# Altium schematic symbol library jlcpcb_2025_04_capacitors_extended_1206.schlib: 2503 symbols (part 4 of 14) (continued)
## C1206N220J102T
designator C?  Capacitance: 22pF  (hidden comment: *)
Capacitor, Ceramic (MLCC), 22pF, ±5%, 1kV, NP0, ±5%, SMD 1206; Manufacturer: IHHEC(HOLY STONE ENTERPRISE CO., LTD); Manufacturer Part Number: C1206N220J102T; Package Size: 1206; JLCPCB Basic Part: No; JLCPCB Part Number: C105975; Supplier 1: LCSC; Category: Capacitors - MLCC; Supplier Part Number 1: C105975; Tolerance: ±5%; Voltage Rating: 1kV; Temperature Coefficient: NP0; RoHS: Yes; ComponentLink1Description: Datasheet; ComponentLink1URL: https://wmsc.lcsc.com/wmsc/upload/file/pdf/v2/lcsc/2304140030_IHHEC-HOLY-STONE-ENTERPRISE-CO---LTD-C1206N220J102T_C105975.pdf; ComponentLink2Description: JLCPCB Part URL; ComponentLink2URL: https://jlcpcb.com/partdetail/C105975; ComponentLink3Description: LCSC Part URL; ComponentLink3URL: https://lcsc.com/product-detail/Multilayer-Ceramic-Capacitors-MLCC---SMD-SMT_IHHECHOLY-STONE-ENTERPRISE-CO.%2C-LTD-IHHECHOLY-STONE-ENTERPRISE-CO.%2C-LTD-C1206N220J102T_C105975.html
footprint CAP-1206 (1206 (3216M) Capacitor)
pins: 1, 2

## C1206N221J102T
designator C?  Capacitance: 220pF  (hidden comment: *)
Capacitor, Ceramic (MLCC), 220pF, ±5%, 1kV, C0G, ±5%, SMD 1206; Manufacturer: IHHEC(HOLY STONE ENTERPRISE CO., LTD); Manufacturer Part Number: C1206N221J102T; Package Size: 1206; JLCPCB Basic Part: No; JLCPCB Part Number: C105976; Supplier 1: LCSC; Category: Capacitors - MLCC; Supplier Part Number 1: C105976; Tolerance: ±5%; Voltage Rating: 1kV; Temperature Coefficient: C0G; RoHS: Yes; ComponentLink1Description: Datasheet; ComponentLink1URL: https://wmsc.lcsc.com/wmsc/upload/file/pdf/v2/lcsc/2304140030_IHHEC-HOLY-STONE-ENTERPRISE-CO---LTD-C1206N221J102T_C105976.pdf; ComponentLink2Description: JLCPCB Part URL; ComponentLink2URL: https://jlcpcb.com/partdetail/C105976; ComponentLink3Description: LCSC Part URL; ComponentLink3URL: https://lcsc.com/product-detail/Multilayer-Ceramic-Capacitors-MLCC---SMD-SMT_IHHECHOLY-STONE-ENTERPRISE-CO.%2C-LTD-IHHECHOLY-STONE-ENTERPRISE-CO.%2C-LTD-C1206N221J102T_C105976.html
footprint CAP-1206 (1206 (3216M) Capacitor)
pins: 1, 2

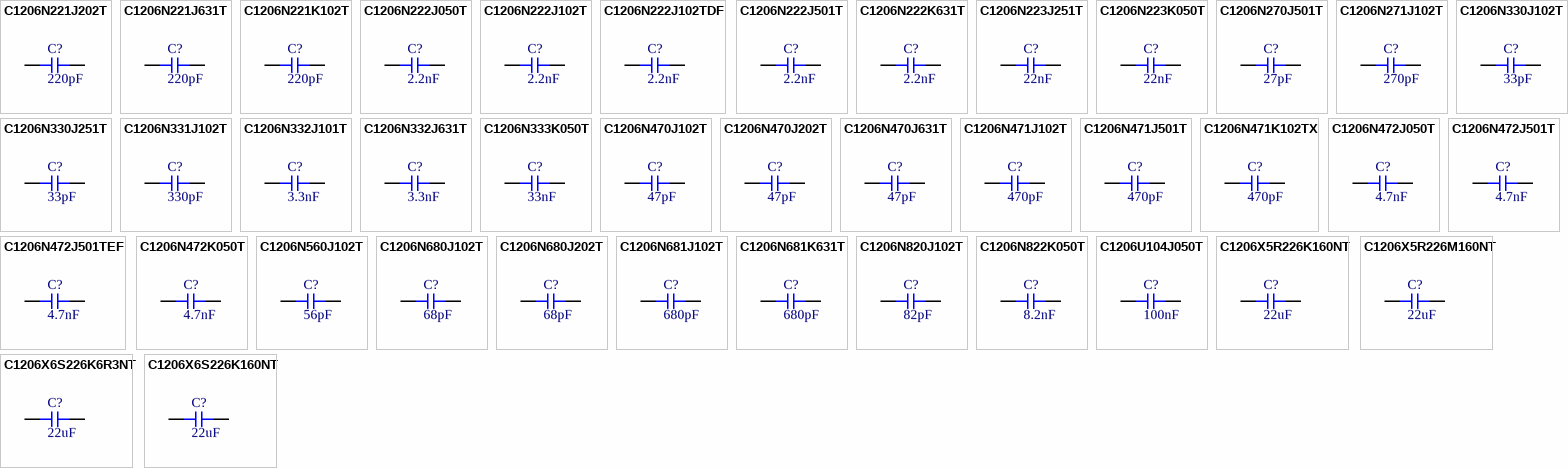
[diagram p17: symbols C1206N221J202T to C1206X6S226K160NT]

## C1206N221J202T
designator C?  Capacitance: 220pF  (hidden comment: *)
Capacitor, Ceramic (MLCC), 220pF, ±5%, 2kV, C0G, ±5%, SMD 1206; Manufacturer: IHHEC(HOLY STONE ENTERPRISE CO., LTD); Manufacturer Part Number: C1206N221J202T; Package Size: 1206; JLCPCB Basic Part: No; JLCPCB Part Number: C105977; Supplier 1: LCSC; Category: Capacitors - MLCC; Supplier Part Number 1: C105977; Tolerance: ±5%; Voltage Rating: 2kV; Temperature Coefficient: C0G; RoHS: Yes; ComponentLink1Description: Datasheet; ComponentLink1URL: https://wmsc.lcsc.com/wmsc/upload/file/pdf/v2/lcsc/2304140030_IHHEC-HOLY-STONE-ENTERPRISE-CO---LTD-C1206N221J202T_C105977.pdf; ComponentLink2Description: JLCPCB Part URL; ComponentLink2URL: https://jlcpcb.com/partdetail/C105977; ComponentLink3Description: LCSC Part URL; ComponentLink3URL: https://lcsc.com/product-detail/Multilayer-Ceramic-Capacitors-MLCC---SMD-SMT_IHHECHOLY-STONE-ENTERPRISE-CO.%2C-LTD-IHHECHOLY-STONE-ENTERPRISE-CO.%2C-LTD-C1206N221J202T_C105977.html
footprint CAP-1206 (1206 (3216M) Capacitor)
pins: 1, 2

## C1206N221J631T
designator C?  Capacitance: 220pF  (hidden comment: *)
Capacitor, Ceramic (MLCC), 220pF, ±5%, 630V, NP0, ±5%, SMD 1206; Manufacturer: IHHEC(HOLY STONE ENTERPRISE CO., LTD); Manufacturer Part Number: C1206N221J631T; Package Size: 1206; JLCPCB Basic Part: No; JLCPCB Part Number: C915819; Supplier 1: LCSC; Category: Capacitors - MLCC; Supplier Part Number 1: C915819; Tolerance: ±5%; Voltage Rating: 630V; Temperature Coefficient: NP0; RoHS: Yes; ComponentLink1Description: Datasheet; ComponentLink1URL: https://wmsc.lcsc.com/wmsc/upload/file/pdf/v2/lcsc/2304140030_IHHEC-HOLY-STONE-ENTERPRISE-CO---LTD-C1206N221J631T_C915819.pdf; ComponentLink2Description: JLCPCB Part URL; ComponentLink2URL: https://jlcpcb.com/partdetail/C915819; ComponentLink3Description: LCSC Part URL; ComponentLink3URL: https://lcsc.com/product-detail/Multilayer-Ceramic-Capacitors-MLCC---SMD-SMT_IHHECHOLY-STONE-ENTERPRISE-CO.%2C-LTD-IHHECHOLY-STONE-ENTERPRISE-CO.%2C-LTD-C1206N221J631T_C915819.html
footprint CAP-1206 (1206 (3216M) Capacitor)
pins: 1, 2

## C1206N221K102T
designator C?  Capacitance: 220pF  (hidden comment: *)
Capacitor, Ceramic (MLCC), 220pF, ±10%, 1kV, NP0, ±10%, SMD 1206; Manufacturer: IHHEC(HOLY STONE ENTERPRISE CO., LTD); Manufacturer Part Number: C1206N221K102T; Package Size: 1206; JLCPCB Basic Part: No; JLCPCB Part Number: C2826587; Supplier 1: LCSC; Category: Capacitors - MLCC; Supplier Part Number 1: C2826587; Tolerance: ±10%; Voltage Rating: 1kV; Temperature Coefficient: NP0; RoHS: Yes; ComponentLink1Description: Datasheet; ComponentLink2Description: JLCPCB Part URL; ComponentLink2URL: https://jlcpcb.com/partdetail/C2826587; ComponentLink3Description: LCSC Part URL; ComponentLink3URL: https://lcsc.com/product-detail/Multilayer-Ceramic-Capacitors-MLCC---SMD-SMT_IHHECHOLY-STONE-ENTERPRISE-CO.%2C-LTD-IHHECHOLY-STONE-ENTERPRISE-CO.%2C-LTD-C1206N221K102T_C2826587.html
footprint CAP-1206 (1206 (3216M) Capacitor)
pins: 1, 2

## C1206N222J050T
designator C?  Capacitance: 2.2nF  (hidden comment: *)
Capacitor, Ceramic (MLCC), 2.2nF, ±5%, 50V, NP0, ±5%, SMD 1206; Manufacturer: IHHEC(HOLY STONE ENTERPRISE CO., LTD); Manufacturer Part Number: C1206N222J050T; Package Size: 1206; JLCPCB Basic Part: No; JLCPCB Part Number: C105978; Supplier 1: LCSC; Category: Capacitors - MLCC; Supplier Part Number 1: C105978; Tolerance: ±5%; Voltage Rating: 50V; Temperature Coefficient: NP0; RoHS: Yes; ComponentLink1Description: Datasheet; ComponentLink1URL: https://wmsc.lcsc.com/wmsc/upload/file/pdf/v2/lcsc/2304140030_IHHEC-HOLY-STONE-ENTERPRISE-CO---LTD-C1206N222J050T_C105978.pdf; ComponentLink2Description: JLCPCB Part URL; ComponentLink2URL: https://jlcpcb.com/partdetail/C105978; ComponentLink3Description: LCSC Part URL; ComponentLink3URL: https://lcsc.com/product-detail/Multilayer-Ceramic-Capacitors-MLCC---SMD-SMT_IHHECHOLY-STONE-ENTERPRISE-CO.%2C-LTD-IHHECHOLY-STONE-ENTERPRISE-CO.%2C-LTD-C1206N222J050T_C105978.html
footprint CAP-1206 (1206 (3216M) Capacitor)
pins: 1, 2

## C1206N222J102T
designator C?  Capacitance: 2.2nF  (hidden comment: *)
Capacitor, Ceramic (MLCC), 2.2nF, 1kV, NP0, SMD 1206; Manufacturer: IHHEC(HOLY STONE ENTERPRISE CO., LTD); Manufacturer Part Number: C1206N222J102T; Package Size: 1206; JLCPCB Basic Part: No; JLCPCB Part Number: C2998557; Supplier 1: LCSC; Category: Capacitors - MLCC; Supplier Part Number 1: C2998557; Voltage Rating: 1kV; Temperature Coefficient: NP0; RoHS: Yes; ComponentLink1Description: Datasheet; ComponentLink1URL: https://wmsc.lcsc.com/wmsc/upload/file/pdf/v2/lcsc/2205051716_IHHEC-HOLY-STONE-ENTERPRISE-CO---LTD-C1206N222J102T_C2998557.pdf; ComponentLink2Description: JLCPCB Part URL; ComponentLink2URL: https://jlcpcb.com/partdetail/C2998557; ComponentLink3Description: LCSC Part URL; ComponentLink3URL: https://lcsc.com/product-detail/Multilayer-Ceramic-Capacitors-MLCC---SMD-SMT_IHHECHOLY-STONE-ENTERPRISE-CO.%2C-LTD-IHHECHOLY-STONE-ENTERPRISE-CO.%2C-LTD-C1206N222J102T_C2998557.html
footprint CAP-1206 (1206 (3216M) Capacitor)
pins: 1, 2

## C1206N222J102TDF
designator C?  Capacitance: 2.2nF  (hidden comment: *)
Capacitor, Ceramic (MLCC), 2.2nF, ±5%, 1kV, NP0, ±5%, SMD 1206; Manufacturer: IHHEC(HOLY STONE ENTERPRISE CO., LTD); Manufacturer Part Number: C1206N222J102TDF; Package Size: 1206; JLCPCB Basic Part: No; JLCPCB Part Number: C4355181; Supplier 1: LCSC; Category: Capacitors - MLCC; Supplier Part Number 1: C4355181; Tolerance: ±5%; Voltage Rating: 1kV; Temperature Coefficient: NP0; RoHS: Yes; ComponentLink1Description: Datasheet; ComponentLink1URL: https://wmsc.lcsc.com/wmsc/upload/file/pdf/v2/lcsc/2207151800_IHHEC-HOLY-STONE-ENTERPRISE-CO---LTD-C1206N222J102TDF_C4355181.pdf; ComponentLink2Description: JLCPCB Part URL; ComponentLink2URL: https://jlcpcb.com/partdetail/C4355181; ComponentLink3Description: LCSC Part URL; ComponentLink3URL: https://lcsc.com/product-detail/Multilayer-Ceramic-Capacitors-MLCC---SMD-SMT_IHHECHOLY-STONE-ENTERPRISE-CO.%2C-LTD-IHHECHOLY-STONE-ENTERPRISE-CO.%2C-LTD-C1206N222J102TDF_C4355181.html
footprint CAP-1206 (1206 (3216M) Capacitor)
pins: 1, 2

## C1206N222J501T
designator C?  Capacitance: 2.2nF  (hidden comment: *)
Capacitor, Ceramic (MLCC), 2.2nF, ±5%, 500V, NP0, ±5%, SMD 1206; Manufacturer: IHHEC(HOLY STONE ENTERPRISE CO., LTD); Manufacturer Part Number: C1206N222J501T; Package Size: 1206; JLCPCB Basic Part: No; JLCPCB Part Number: C105979; Supplier 1: LCSC; Category: Capacitors - MLCC; Supplier Part Number 1: C105979; Tolerance: ±5%; Voltage Rating: 500V; Temperature Coefficient: NP0; RoHS: Yes; ComponentLink1Description: Datasheet; ComponentLink1URL: https://wmsc.lcsc.com/wmsc/upload/file/pdf/v2/lcsc/2304140030_IHHEC-HOLY-STONE-ENTERPRISE-CO---LTD-C1206N222J501T_C105979.pdf; ComponentLink2Description: JLCPCB Part URL; ComponentLink2URL: https://jlcpcb.com/partdetail/C105979; ComponentLink3Description: LCSC Part URL; ComponentLink3URL: https://lcsc.com/product-detail/Multilayer-Ceramic-Capacitors-MLCC---SMD-SMT_IHHECHOLY-STONE-ENTERPRISE-CO.%2C-LTD-IHHECHOLY-STONE-ENTERPRISE-CO.%2C-LTD-C1206N222J501T_C105979.html
footprint CAP-1206 (1206 (3216M) Capacitor)
pins: 1, 2

## C1206N222K631T
designator C?  Capacitance: 2.2nF  (hidden comment: *)
Capacitor, Ceramic (MLCC), 2.2nF, ±10%, 630V, NP0, ±10%, SMD 1206; Manufacturer: IHHEC(HOLY STONE ENTERPRISE CO., LTD); Manufacturer Part Number: C1206N222K631T; Package Size: 1206; JLCPCB Basic Part: No; JLCPCB Part Number: C213491; Supplier 1: LCSC; Category: Capacitors - MLCC; Supplier Part Number 1: C213491; Tolerance: ±10%; Voltage Rating: 630V; Temperature Coefficient: NP0; RoHS: Yes; ComponentLink1Description: Datasheet; ComponentLink2Description: JLCPCB Part URL; ComponentLink2URL: https://jlcpcb.com/partdetail/C213491; ComponentLink3Description: LCSC Part URL; ComponentLink3URL: https://lcsc.com/product-detail/Multilayer-Ceramic-Capacitors-MLCC---SMD-SMT_IHHECHOLY-STONE-ENTERPRISE-CO.%2C-LTD-IHHECHOLY-STONE-ENTERPRISE-CO.%2C-LTD-C1206N222K631T_C213491.html
footprint CAP-1206 (1206 (3216M) Capacitor)
pins: 1, 2

## C1206N223J251T
designator C?  Capacitance: 22nF  (hidden comment: *)
Capacitor, Ceramic (MLCC), 22nF, 250V, NP0, SMD 1206; Manufacturer: IHHEC(HOLY STONE ENTERPRISE CO., LTD); Manufacturer Part Number: C1206N223J251T; Package Size: 1206; JLCPCB Basic Part: No; JLCPCB Part Number: C2915757; Supplier 1: LCSC; Category: Capacitors - MLCC; Supplier Part Number 1: C2915757; Voltage Rating: 250V; Temperature Coefficient: NP0; RoHS: Yes; ComponentLink1Description: Datasheet; ComponentLink1URL: https://wmsc.lcsc.com/wmsc/upload/file/pdf/v2/lcsc/2111172030_IHHEC-HOLY-STONE-ENTERPRISE-CO---LTD-C1206N223J251T_C2915757.pdf; ComponentLink2Description: JLCPCB Part URL; ComponentLink2URL: https://jlcpcb.com/partdetail/C2915757; ComponentLink3Description: LCSC Part URL; ComponentLink3URL: https://lcsc.com/product-detail/Multilayer-Ceramic-Capacitors-MLCC---SMD-SMT_IHHECHOLY-STONE-ENTERPRISE-CO.%2C-LTD-IHHECHOLY-STONE-ENTERPRISE-CO.%2C-LTD-C1206N223J251T_C2915757.html
footprint CAP-1206 (1206 (3216M) Capacitor)
pins: 1, 2

## C1206N223K050T
designator C?  Capacitance: 22nF  (hidden comment: *)
Capacitor, Ceramic (MLCC), 22nF, ±10%, 50V, NP0, ±10%, SMD 1206; Manufacturer: IHHEC(HOLY STONE ENTERPRISE CO., LTD); Manufacturer Part Number: C1206N223K050T; Package Size: 1206; JLCPCB Basic Part: No; JLCPCB Part Number: C105982; Supplier 1: LCSC; Category: Capacitors - MLCC; Supplier Part Number 1: C105982; Tolerance: ±10%; Voltage Rating: 50V; Temperature Coefficient: NP0; RoHS: Yes; ComponentLink1Description: Datasheet; ComponentLink1URL: https://wmsc.lcsc.com/wmsc/upload/file/pdf/v2/lcsc/2304140030_IHHEC-HOLY-STONE-ENTERPRISE-CO---LTD-C1206N223K050T_C105982.pdf; ComponentLink2Description: JLCPCB Part URL; ComponentLink2URL: https://jlcpcb.com/partdetail/C105982; ComponentLink3Description: LCSC Part URL; ComponentLink3URL: https://lcsc.com/product-detail/Multilayer-Ceramic-Capacitors-MLCC---SMD-SMT_IHHECHOLY-STONE-ENTERPRISE-CO.%2C-LTD-IHHECHOLY-STONE-ENTERPRISE-CO.%2C-LTD-C1206N223K050T_C105982.html
footprint CAP-1206 (1206 (3216M) Capacitor)
pins: 1, 2

## C1206N270J501T
designator C?  Capacitance: 27pF  (hidden comment: *)
Capacitor, Ceramic (MLCC), 27pF, ±5%, 500V, NP0, ±5%, SMD 1206; Manufacturer: IHHEC(HOLY STONE ENTERPRISE CO., LTD); Manufacturer Part Number: C1206N270J501T; Package Size: 1206; JLCPCB Basic Part: No; JLCPCB Part Number: C559302; Supplier 1: LCSC; Category: Capacitors - MLCC; Supplier Part Number 1: C559302; Tolerance: ±5%; Voltage Rating: 500V; Temperature Coefficient: NP0; RoHS: Yes; ComponentLink1Description: Datasheet; ComponentLink1URL: https://wmsc.lcsc.com/wmsc/upload/file/pdf/v2/lcsc/2304140030_IHHEC-HOLY-STONE-ENTERPRISE-CO---LTD-C1206N270J501T_C559302.pdf; ComponentLink2Description: JLCPCB Part URL; ComponentLink2URL: https://jlcpcb.com/partdetail/C559302; ComponentLink3Description: LCSC Part URL; ComponentLink3URL: https://lcsc.com/product-detail/Multilayer-Ceramic-Capacitors-MLCC---SMD-SMT_IHHECHOLY-STONE-ENTERPRISE-CO.%2C-LTD-IHHECHOLY-STONE-ENTERPRISE-CO.%2C-LTD-C1206N270J501T_C559302.html
footprint CAP-1206 (1206 (3216M) Capacitor)
pins: 1, 2

## C1206N271J102T
designator C?  Capacitance: 270pF  (hidden comment: *)
Capacitor, Ceramic (MLCC), 270pF, ±5%, 1kV, NP0, ±5%, SMD 1206; Manufacturer: IHHEC(HOLY STONE ENTERPRISE CO., LTD); Manufacturer Part Number: C1206N271J102T; Package Size: 1206; JLCPCB Basic Part: No; JLCPCB Part Number: C105983; Supplier 1: LCSC; Category: Capacitors - MLCC; Supplier Part Number 1: C105983; Tolerance: ±5%; Voltage Rating: 1kV; Temperature Coefficient: NP0; RoHS: Yes; ComponentLink1Description: Datasheet; ComponentLink1URL: https://wmsc.lcsc.com/wmsc/upload/file/pdf/v2/lcsc/2304140030_IHHEC-HOLY-STONE-ENTERPRISE-CO---LTD-C1206N271J102T_C105983.pdf; ComponentLink2Description: JLCPCB Part URL; ComponentLink2URL: https://jlcpcb.com/partdetail/C105983; ComponentLink3Description: LCSC Part URL; ComponentLink3URL: https://lcsc.com/product-detail/Multilayer-Ceramic-Capacitors-MLCC---SMD-SMT_IHHECHOLY-STONE-ENTERPRISE-CO.%2C-LTD-IHHECHOLY-STONE-ENTERPRISE-CO.%2C-LTD-C1206N271J102T_C105983.html
footprint CAP-1206 (1206 (3216M) Capacitor)
pins: 1, 2

## C1206N330J102T
designator C?  Capacitance: 33pF  (hidden comment: *)
Capacitor, Ceramic (MLCC), 33pF, ±5%, 1kV, C0G, ±5%, SMD 1206; Manufacturer: IHHEC(HOLY STONE ENTERPRISE CO., LTD); Manufacturer Part Number: C1206N330J102T; Package Size: 1206; JLCPCB Basic Part: No; JLCPCB Part Number: C105984; Supplier 1: LCSC; Category: Capacitors - MLCC; Supplier Part Number 1: C105984; Tolerance: ±5%; Voltage Rating: 1kV; Temperature Coefficient: C0G; RoHS: Yes; ComponentLink1Description: Datasheet; ComponentLink1URL: https://wmsc.lcsc.com/wmsc/upload/file/pdf/v2/lcsc/2304140030_IHHEC-HOLY-STONE-ENTERPRISE-CO---LTD-C1206N330J102T_C105984.pdf; ComponentLink2Description: JLCPCB Part URL; ComponentLink2URL: https://jlcpcb.com/partdetail/C105984; ComponentLink3Description: LCSC Part URL; ComponentLink3URL: https://lcsc.com/product-detail/Multilayer-Ceramic-Capacitors-MLCC---SMD-SMT_IHHECHOLY-STONE-ENTERPRISE-CO.%2C-LTD-IHHECHOLY-STONE-ENTERPRISE-CO.%2C-LTD-C1206N330J102T_C105984.html
footprint CAP-1206 (1206 (3216M) Capacitor)
pins: 1, 2

## C1206N330J251T
designator C?  Capacitance: 33pF  (hidden comment: *)
Capacitor, Ceramic (MLCC), 33pF, ±5%, 250V, NP0, ±5%, SMD 1206; Manufacturer: IHHEC(HOLY STONE ENTERPRISE CO., LTD); Manufacturer Part Number: C1206N330J251T; Package Size: 1206; JLCPCB Basic Part: No; JLCPCB Part Number: C340312; Supplier 1: LCSC; Category: Capacitors - MLCC; Supplier Part Number 1: C340312; Tolerance: ±5%; Voltage Rating: 250V; Temperature Coefficient: NP0; RoHS: Yes; ComponentLink1Description: Datasheet; ComponentLink1URL: https://wmsc.lcsc.com/wmsc/upload/file/pdf/v2/lcsc/2304140030_IHHEC-HOLY-STONE-ENTERPRISE-CO---LTD-C1206N330J251T_C340312.pdf; ComponentLink2Description: JLCPCB Part URL; ComponentLink2URL: https://jlcpcb.com/partdetail/C340312; ComponentLink3Description: LCSC Part URL; ComponentLink3URL: https://lcsc.com/product-detail/Multilayer-Ceramic-Capacitors-MLCC---SMD-SMT_IHHECHOLY-STONE-ENTERPRISE-CO.%2C-LTD-IHHECHOLY-STONE-ENTERPRISE-CO.%2C-LTD-C1206N330J251T_C340312.html
footprint CAP-1206 (1206 (3216M) Capacitor)
pins: 1, 2

## C1206N331J102T
designator C?  Capacitance: 330pF  (hidden comment: *)
Capacitor, Ceramic (MLCC), 330pF, ±5%, 1kV, NP0, ±5%, SMD 1206; Manufacturer: IHHEC(HOLY STONE ENTERPRISE CO., LTD); Manufacturer Part Number: C1206N331J102T; Package Size: 1206; JLCPCB Basic Part: No; JLCPCB Part Number: C502158; Supplier 1: LCSC; Category: Capacitors - MLCC; Supplier Part Number 1: C502158; Tolerance: ±5%; Voltage Rating: 1kV; Temperature Coefficient: NP0; RoHS: Yes; ComponentLink1Description: Datasheet; ComponentLink1URL: https://wmsc.lcsc.com/wmsc/upload/file/pdf/v2/lcsc/2304140030_IHHEC-HOLY-STONE-ENTERPRISE-CO---LTD-C1206N331J102T_C502158.pdf; ComponentLink2Description: JLCPCB Part URL; ComponentLink2URL: https://jlcpcb.com/partdetail/C502158; ComponentLink3Description: LCSC Part URL; ComponentLink3URL: https://lcsc.com/product-detail/Multilayer-Ceramic-Capacitors-MLCC---SMD-SMT_IHHECHOLY-STONE-ENTERPRISE-CO.%2C-LTD-IHHECHOLY-STONE-ENTERPRISE-CO.%2C-LTD-C1206N331J102T_C502158.html
footprint CAP-1206 (1206 (3216M) Capacitor)
pins: 1, 2

## C1206N332J101T
designator C?  Capacitance: 3.3nF  (hidden comment: *)
Capacitor, Ceramic (MLCC), 3.3nF, ±5%, 100V, NP0, ±5%, SMD 1206; Manufacturer: IHHEC(HOLY STONE ENTERPRISE CO., LTD); Manufacturer Part Number: C1206N332J101T; Package Size: 1206; JLCPCB Basic Part: No; JLCPCB Part Number: C105986; Supplier 1: LCSC; Category: Capacitors - MLCC; Supplier Part Number 1: C105986; Tolerance: ±5%; Voltage Rating: 100V; Temperature Coefficient: NP0; RoHS: Yes; ComponentLink1Description: Datasheet; ComponentLink1URL: https://wmsc.lcsc.com/wmsc/upload/file/pdf/v2/lcsc/2304140030_IHHEC-HOLY-STONE-ENTERPRISE-CO---LTD-C1206N332J101T_C105986.pdf; ComponentLink2Description: JLCPCB Part URL; ComponentLink2URL: https://jlcpcb.com/partdetail/C105986; ComponentLink3Description: LCSC Part URL; ComponentLink3URL: https://lcsc.com/product-detail/Multilayer-Ceramic-Capacitors-MLCC---SMD-SMT_IHHECHOLY-STONE-ENTERPRISE-CO.%2C-LTD-IHHECHOLY-STONE-ENTERPRISE-CO.%2C-LTD-C1206N332J101T_C105986.html
footprint CAP-1206 (1206 (3216M) Capacitor)
pins: 1, 2

## C1206N332J631T
designator C?  Capacitance: 3.3nF  (hidden comment: *)
Capacitor, Ceramic (MLCC), 3.3nF, ±5%, 630V, NP0, ±5%, SMD 1206; Manufacturer: IHHEC(HOLY STONE ENTERPRISE CO., LTD); Manufacturer Part Number: C1206N332J631T; Package Size: 1206; JLCPCB Basic Part: No; JLCPCB Part Number: C105987; Supplier 1: LCSC; Category: Capacitors - MLCC; Supplier Part Number 1: C105987; Tolerance: ±5%; Voltage Rating: 630V; Temperature Coefficient: NP0; RoHS: Yes; ComponentLink1Description: Datasheet; ComponentLink1URL: https://wmsc.lcsc.com/wmsc/upload/file/pdf/v2/lcsc/2208241530_IHHEC-HOLY-STONE-ENTERPRISE-CO---LTD-C1206N332J631T_C105987.pdf; ComponentLink2Description: JLCPCB Part URL; ComponentLink2URL: https://jlcpcb.com/partdetail/C105987; ComponentLink3Description: LCSC Part URL; ComponentLink3URL: https://lcsc.com/product-detail/Multilayer-Ceramic-Capacitors-MLCC---SMD-SMT_IHHECHOLY-STONE-ENTERPRISE-CO.%2C-LTD-IHHECHOLY-STONE-ENTERPRISE-CO.%2C-LTD-C1206N332J631T_C105987.html
footprint CAP-1206 (1206 (3216M) Capacitor)
pins: 1, 2

## C1206N333K050T
designator C?  Capacitance: 33nF  (hidden comment: *)
Capacitor, Ceramic (MLCC), 33nF, ±10%, 50V, NP0, ±10%, SMD 1206; Manufacturer: IHHEC(HOLY STONE ENTERPRISE CO., LTD); Manufacturer Part Number: C1206N333K050T; Package Size: 1206; JLCPCB Basic Part: No; JLCPCB Part Number: C105988; Supplier 1: LCSC; Category: Capacitors - MLCC; Supplier Part Number 1: C105988; Tolerance: ±10%; Voltage Rating: 50V; Temperature Coefficient: NP0; RoHS: Yes; ComponentLink1Description: Datasheet; ComponentLink1URL: https://wmsc.lcsc.com/wmsc/upload/file/pdf/v2/lcsc/2304140030_IHHEC-HOLY-STONE-ENTERPRISE-CO---LTD-C1206N333K050T_C105988.pdf; ComponentLink2Description: JLCPCB Part URL; ComponentLink2URL: https://jlcpcb.com/partdetail/C105988; ComponentLink3Description: LCSC Part URL; ComponentLink3URL: https://lcsc.com/product-detail/Multilayer-Ceramic-Capacitors-MLCC---SMD-SMT_IHHECHOLY-STONE-ENTERPRISE-CO.%2C-LTD-IHHECHOLY-STONE-ENTERPRISE-CO.%2C-LTD-C1206N333K050T_C105988.html
footprint CAP-1206 (1206 (3216M) Capacitor)
pins: 1, 2

## C1206N470J102T
designator C?  Capacitance: 47pF  (hidden comment: *)
Capacitor, Ceramic (MLCC), 47pF, ±5%, 1kV, C0G, ±5%, SMD 1206; Manufacturer: IHHEC(HOLY STONE ENTERPRISE CO., LTD); Manufacturer Part Number: C1206N470J102T; Package Size: 1206; JLCPCB Basic Part: No; JLCPCB Part Number: C105991; Supplier 1: LCSC; Category: Capacitors - MLCC; Supplier Part Number 1: C105991; Tolerance: ±5%; Voltage Rating: 1kV; Temperature Coefficient: C0G; RoHS: Yes; ComponentLink1Description: Datasheet; ComponentLink1URL: https://wmsc.lcsc.com/wmsc/upload/file/pdf/v2/lcsc/2304140030_IHHEC-HOLY-STONE-ENTERPRISE-CO---LTD-C1206N470J102T_C105991.pdf; ComponentLink2Description: JLCPCB Part URL; ComponentLink2URL: https://jlcpcb.com/partdetail/C105991; ComponentLink3Description: LCSC Part URL; ComponentLink3URL: https://lcsc.com/product-detail/Multilayer-Ceramic-Capacitors-MLCC---SMD-SMT_IHHECHOLY-STONE-ENTERPRISE-CO.%2C-LTD-IHHECHOLY-STONE-ENTERPRISE-CO.%2C-LTD-C1206N470J102T_C105991.html
footprint CAP-1206 (1206 (3216M) Capacitor)
pins: 1, 2

## C1206N470J202T
designator C?  Capacitance: 47pF  (hidden comment: *)
Capacitor, Ceramic (MLCC), 47pF, ±5%, 2kV, C0G, ±5%, SMD 1206; Manufacturer: IHHEC(HOLY STONE ENTERPRISE CO., LTD); Manufacturer Part Number: C1206N470J202T; Package Size: 1206; JLCPCB Basic Part: No; JLCPCB Part Number: C105992; Supplier 1: LCSC; Category: Capacitors - MLCC; Supplier Part Number 1: C105992; Tolerance: ±5%; Voltage Rating: 2kV; Temperature Coefficient: C0G; RoHS: Yes; ComponentLink1Description: Datasheet; ComponentLink1URL: https://wmsc.lcsc.com/wmsc/upload/file/pdf/v2/lcsc/2304140030_IHHEC-HOLY-STONE-ENTERPRISE-CO---LTD-C1206N470J202T_C105992.pdf; ComponentLink2Description: JLCPCB Part URL; ComponentLink2URL: https://jlcpcb.com/partdetail/C105992; ComponentLink3Description: LCSC Part URL; ComponentLink3URL: https://lcsc.com/product-detail/Multilayer-Ceramic-Capacitors-MLCC---SMD-SMT_IHHECHOLY-STONE-ENTERPRISE-CO.%2C-LTD-IHHECHOLY-STONE-ENTERPRISE-CO.%2C-LTD-C1206N470J202T_C105992.html
footprint CAP-1206 (1206 (3216M) Capacitor)
pins: 1, 2

## C1206N470J631T
designator C?  Capacitance: 47pF  (hidden comment: *)
Capacitor, Ceramic (MLCC), 47pF, ±5%, 630V, NP0, ±5%, SMD 1206; Manufacturer: IHHEC(HOLY STONE ENTERPRISE CO., LTD); Manufacturer Part Number: C1206N470J631T; Package Size: 1206; JLCPCB Basic Part: No; JLCPCB Part Number: C337980; Supplier 1: LCSC; Category: Capacitors - MLCC; Supplier Part Number 1: C337980; Tolerance: ±5%; Voltage Rating: 630V; Temperature Coefficient: NP0; RoHS: Yes; ComponentLink1Description: Datasheet; ComponentLink1URL: https://wmsc.lcsc.com/wmsc/upload/file/pdf/v2/lcsc/2304140030_IHHEC-HOLY-STONE-ENTERPRISE-CO---LTD-C1206N470J631T_C337980.pdf; ComponentLink2Description: JLCPCB Part URL; ComponentLink2URL: https://jlcpcb.com/partdetail/C337980; ComponentLink3Description: LCSC Part URL; ComponentLink3URL: https://lcsc.com/product-detail/Multilayer-Ceramic-Capacitors-MLCC---SMD-SMT_IHHECHOLY-STONE-ENTERPRISE-CO.%2C-LTD-IHHECHOLY-STONE-ENTERPRISE-CO.%2C-LTD-C1206N470J631T_C337980.html
footprint CAP-1206 (1206 (3216M) Capacitor)
pins: 1, 2

## C1206N471J102T
designator C?  Capacitance: 470pF  (hidden comment: *)
Capacitor, Ceramic (MLCC), 470pF, ±5%, 1kV, C0G, ±5%, SMD 1206; Manufacturer: IHHEC(HOLY STONE ENTERPRISE CO., LTD); Manufacturer Part Number: C1206N471J102T; Package Size: 1206; JLCPCB Basic Part: No; JLCPCB Part Number: C105994; Supplier 1: LCSC; Category: Capacitors - MLCC; Supplier Part Number 1: C105994; Tolerance: ±5%; Voltage Rating: 1kV; Temperature Coefficient: C0G; RoHS: Yes; ComponentLink1Description: Datasheet; ComponentLink1URL: https://wmsc.lcsc.com/wmsc/upload/file/pdf/v2/lcsc/2304140030_IHHEC-HOLY-STONE-ENTERPRISE-CO---LTD-C1206N471J102T_C105994.pdf; ComponentLink2Description: JLCPCB Part URL; ComponentLink2URL: https://jlcpcb.com/partdetail/C105994; ComponentLink3Description: LCSC Part URL; ComponentLink3URL: https://lcsc.com/product-detail/Multilayer-Ceramic-Capacitors-MLCC---SMD-SMT_IHHECHOLY-STONE-ENTERPRISE-CO.%2C-LTD-IHHECHOLY-STONE-ENTERPRISE-CO.%2C-LTD-C1206N471J102T_C105994.html
footprint CAP-1206 (1206 (3216M) Capacitor)
pins: 1, 2

## C1206N471J501T
designator C?  Capacitance: 470pF  (hidden comment: *)
Capacitor, Ceramic (MLCC), 470pF, ±5%, 500V, NP0, ±5%, SMD 1206; Manufacturer: IHHEC(HOLY STONE ENTERPRISE CO., LTD); Manufacturer Part Number: C1206N471J501T; Package Size: 1206; JLCPCB Basic Part: No; JLCPCB Part Number: C105995; Supplier 1: LCSC; Category: Capacitors - MLCC; Supplier Part Number 1: C105995; Tolerance: ±5%; Voltage Rating: 500V; Temperature Coefficient: NP0; RoHS: Yes; ComponentLink1Description: Datasheet; ComponentLink1URL: https://wmsc.lcsc.com/wmsc/upload/file/pdf/v2/lcsc/2304140030_IHHEC-HOLY-STONE-ENTERPRISE-CO---LTD-C1206N471J501T_C105995.pdf; ComponentLink2Description: JLCPCB Part URL; ComponentLink2URL: https://jlcpcb.com/partdetail/C105995; ComponentLink3Description: LCSC Part URL; ComponentLink3URL: https://lcsc.com/product-detail/Multilayer-Ceramic-Capacitors-MLCC---SMD-SMT_IHHECHOLY-STONE-ENTERPRISE-CO.%2C-LTD-IHHECHOLY-STONE-ENTERPRISE-CO.%2C-LTD-C1206N471J501T_C105995.html
footprint CAP-1206 (1206 (3216M) Capacitor)
pins: 1, 2

## C1206N471K102TX
designator C?  Capacitance: 470pF  (hidden comment: *)
Capacitor, Ceramic (MLCC), 470pF, ±10%, 1kV, ±10%, SMD 1206; Manufacturer: IHHEC(HOLY STONE ENTERPRISE CO., LTD); Manufacturer Part Number: C1206N471K102TX; Package Size: 1206; JLCPCB Basic Part: No; JLCPCB Part Number: C961518; Supplier 1: LCSC; Category: Capacitors - MLCC; Supplier Part Number 1: C961518; Tolerance: ±10%; Voltage Rating: 1kV; RoHS: Yes; ComponentLink1Description: Datasheet; ComponentLink1URL: https://wmsc.lcsc.com/wmsc/upload/file/pdf/v2/lcsc/2304140030_IHHEC-HOLY-STONE-ENTERPRISE-CO---LTD-C1206N471K102TX_C961518.pdf; ComponentLink2Description: JLCPCB Part URL; ComponentLink2URL: https://jlcpcb.com/partdetail/C961518; ComponentLink3Description: LCSC Part URL; ComponentLink3URL: https://lcsc.com/product-detail/Multilayer-Ceramic-Capacitors-MLCC---SMD-SMT_IHHECHOLY-STONE-ENTERPRISE-CO.%2C-LTD-IHHECHOLY-STONE-ENTERPRISE-CO.%2C-LTD-C1206N471K102TX_C961518.html
footprint CAP-1206 (1206 (3216M) Capacitor)
pins: 1, 2

## C1206N472J050T
designator C?  Capacitance: 4.7nF  (hidden comment: *)
Capacitor, Ceramic (MLCC), 4.7nF, ±5%, 50V, NP0, ±5%, SMD 1206; Manufacturer: IHHEC(HOLY STONE ENTERPRISE CO., LTD); Manufacturer Part Number: C1206N472J050T; Package Size: 1206; JLCPCB Basic Part: No; JLCPCB Part Number: C105996; Supplier 1: LCSC; Category: Capacitors - MLCC; Supplier Part Number 1: C105996; Tolerance: ±5%; Voltage Rating: 50V; Temperature Coefficient: NP0; RoHS: Yes; ComponentLink1Description: Datasheet; ComponentLink1URL: https://wmsc.lcsc.com/wmsc/upload/file/pdf/v2/lcsc/2304140030_IHHEC-HOLY-STONE-ENTERPRISE-CO---LTD-C1206N472J050T_C105996.pdf; ComponentLink2Description: JLCPCB Part URL; ComponentLink2URL: https://jlcpcb.com/partdetail/C105996; ComponentLink3Description: LCSC Part URL; ComponentLink3URL: https://lcsc.com/product-detail/Multilayer-Ceramic-Capacitors-MLCC---SMD-SMT_IHHECHOLY-STONE-ENTERPRISE-CO.%2C-LTD-IHHECHOLY-STONE-ENTERPRISE-CO.%2C-LTD-C1206N472J050T_C105996.html
footprint CAP-1206 (1206 (3216M) Capacitor)
pins: 1, 2

## C1206N472J501T
designator C?  Capacitance: 4.7nF  (hidden comment: *)
Capacitor, Ceramic (MLCC), 4.7nF, ±5%, 500V, NP0, ±5%, SMD 1206; Manufacturer: IHHEC(HOLY STONE ENTERPRISE CO., LTD); Manufacturer Part Number: C1206N472J501T; Package Size: 1206; JLCPCB Basic Part: No; JLCPCB Part Number: C2915758; Supplier 1: LCSC; Category: Capacitors - MLCC; Supplier Part Number 1: C2915758; Tolerance: ±5%; Voltage Rating: 500V; Temperature Coefficient: NP0; RoHS: Yes; ComponentLink1Description: Datasheet; ComponentLink1URL: https://wmsc.lcsc.com/wmsc/upload/file/pdf/v2/lcsc/2111172030_IHHEC-HOLY-STONE-ENTERPRISE-CO---LTD-C1206N472J501T_C2915758.pdf; ComponentLink2Description: JLCPCB Part URL; ComponentLink2URL: https://jlcpcb.com/partdetail/C2915758; ComponentLink3Description: LCSC Part URL; ComponentLink3URL: https://lcsc.com/product-detail/Multilayer-Ceramic-Capacitors-MLCC---SMD-SMT_IHHECHOLY-STONE-ENTERPRISE-CO.%2C-LTD-IHHECHOLY-STONE-ENTERPRISE-CO.%2C-LTD-C1206N472J501T_C2915758.html
footprint CAP-1206 (1206 (3216M) Capacitor)
pins: 1, 2

## C1206N472J501TEF
designator C?  Capacitance: 4.7nF  (hidden comment: *)
Capacitor, Ceramic (MLCC), 4.7nF, 500V, NP0, SMD 1206; Manufacturer: IHHEC(HOLY STONE ENTERPRISE CO., LTD); Manufacturer Part Number: C1206N472J501TEF; Package Size: 1206; JLCPCB Basic Part: No; JLCPCB Part Number: C2991917; Supplier 1: LCSC; Category: Capacitors - MLCC; Supplier Part Number 1: C2991917; Voltage Rating: 500V; Temperature Coefficient: NP0; RoHS: Yes; ComponentLink1Description: Datasheet; ComponentLink1URL: https://wmsc.lcsc.com/wmsc/upload/file/pdf/v2/lcsc/2204220915_IHHEC-HOLY-STONE-ENTERPRISE-CO---LTD-C1206N472J501TEF_C2991917.pdf; ComponentLink2Description: JLCPCB Part URL; ComponentLink2URL: https://jlcpcb.com/partdetail/C2991917; ComponentLink3Description: LCSC Part URL; ComponentLink3URL: https://lcsc.com/product-detail/Multilayer-Ceramic-Capacitors-MLCC---SMD-SMT_IHHECHOLY-STONE-ENTERPRISE-CO.%2C-LTD-IHHECHOLY-STONE-ENTERPRISE-CO.%2C-LTD-C1206N472J501TEF_C2991917.html
footprint CAP-1206 (1206 (3216M) Capacitor)
pins: 1, 2

## C1206N472K050T
designator C?  Capacitance: 4.7nF  (hidden comment: *)
Capacitor, Ceramic (MLCC), 4.7nF, ±10%, 50V, NP0, ±10%, SMD 1206; Manufacturer: IHHEC(HOLY STONE ENTERPRISE CO., LTD); Manufacturer Part Number: C1206N472K050T; Package Size: 1206; JLCPCB Basic Part: No; JLCPCB Part Number: C105997; Supplier 1: LCSC; Category: Capacitors - MLCC; Supplier Part Number 1: C105997; Tolerance: ±10%; Voltage Rating: 50V; Temperature Coefficient: NP0; RoHS: Yes; ComponentLink1Description: Datasheet; ComponentLink1URL: https://wmsc.lcsc.com/wmsc/upload/file/pdf/v2/lcsc/2304140030_IHHEC-HOLY-STONE-ENTERPRISE-CO---LTD-C1206N472K050T_C105997.pdf; ComponentLink2Description: JLCPCB Part URL; ComponentLink2URL: https://jlcpcb.com/partdetail/C105997; ComponentLink3Description: LCSC Part URL; ComponentLink3URL: https://lcsc.com/product-detail/Multilayer-Ceramic-Capacitors-MLCC---SMD-SMT_IHHECHOLY-STONE-ENTERPRISE-CO.%2C-LTD-IHHECHOLY-STONE-ENTERPRISE-CO.%2C-LTD-C1206N472K050T_C105997.html
footprint CAP-1206 (1206 (3216M) Capacitor)
pins: 1, 2

## C1206N560J102T
designator C?  Capacitance: 56pF  (hidden comment: *)
Capacitor, Ceramic (MLCC), 56pF, ±5%, 1kV, C0G, ±5%, SMD 1206; Manufacturer: IHHEC(HOLY STONE ENTERPRISE CO., LTD); Manufacturer Part Number: C1206N560J102T; Package Size: 1206; JLCPCB Basic Part: No; JLCPCB Part Number: C105999; Supplier 1: LCSC; Category: Capacitors - MLCC; Supplier Part Number 1: C105999; Tolerance: ±5%; Voltage Rating: 1kV; Temperature Coefficient: C0G; RoHS: Yes; ComponentLink1Description: Datasheet; ComponentLink1URL: https://wmsc.lcsc.com/wmsc/upload/file/pdf/v2/lcsc/2304140030_IHHEC-HOLY-STONE-ENTERPRISE-CO---LTD-C1206N560J102T_C105999.pdf; ComponentLink2Description: JLCPCB Part URL; ComponentLink2URL: https://jlcpcb.com/partdetail/C105999; ComponentLink3Description: LCSC Part URL; ComponentLink3URL: https://lcsc.com/product-detail/Multilayer-Ceramic-Capacitors-MLCC---SMD-SMT_IHHECHOLY-STONE-ENTERPRISE-CO.%2C-LTD-IHHECHOLY-STONE-ENTERPRISE-CO.%2C-LTD-C1206N560J102T_C105999.html
footprint CAP-1206 (1206 (3216M) Capacitor)
pins: 1, 2

## C1206N680J102T
designator C?  Capacitance: 68pF  (hidden comment: *)
Capacitor, Ceramic (MLCC), 68pF, ±5%, 1kV, C0G, ±5%, SMD 1206; Manufacturer: IHHEC(HOLY STONE ENTERPRISE CO., LTD); Manufacturer Part Number: C1206N680J102T; Package Size: 1206; JLCPCB Basic Part: No; JLCPCB Part Number: C106002; Supplier 1: LCSC; Category: Capacitors - MLCC; Supplier Part Number 1: C106002; Tolerance: ±5%; Voltage Rating: 1kV; Temperature Coefficient: C0G; RoHS: Yes; ComponentLink1Description: Datasheet; ComponentLink1URL: https://wmsc.lcsc.com/wmsc/upload/file/pdf/v2/lcsc/2304140030_IHHEC-HOLY-STONE-ENTERPRISE-CO---LTD-C1206N680J102T_C106002.pdf; ComponentLink2Description: JLCPCB Part URL; ComponentLink2URL: https://jlcpcb.com/partdetail/C106002; ComponentLink3Description: LCSC Part URL; ComponentLink3URL: https://lcsc.com/product-detail/Multilayer-Ceramic-Capacitors-MLCC---SMD-SMT_IHHECHOLY-STONE-ENTERPRISE-CO.%2C-LTD-IHHECHOLY-STONE-ENTERPRISE-CO.%2C-LTD-C1206N680J102T_C106002.html
footprint CAP-1206 (1206 (3216M) Capacitor)
pins: 1, 2

## C1206N680J202T
designator C?  Capacitance: 68pF  (hidden comment: *)
Capacitor, Ceramic (MLCC), 68pF, ±5%, 2kV, NP0, ±5%, SMD 1206; Manufacturer: IHHEC(HOLY STONE ENTERPRISE CO., LTD); Manufacturer Part Number: C1206N680J202T; Package Size: 1206; JLCPCB Basic Part: No; JLCPCB Part Number: C106003; Supplier 1: LCSC; Category: Capacitors - MLCC; Supplier Part Number 1: C106003; Tolerance: ±5%; Voltage Rating: 2kV; Temperature Coefficient: NP0; RoHS: Yes; ComponentLink1Description: Datasheet; ComponentLink1URL: https://wmsc.lcsc.com/wmsc/upload/file/pdf/v2/lcsc/2304140030_IHHEC-HOLY-STONE-ENTERPRISE-CO---LTD-C1206N680J202T_C106003.pdf; ComponentLink2Description: JLCPCB Part URL; ComponentLink2URL: https://jlcpcb.com/partdetail/C106003; ComponentLink3Description: LCSC Part URL; ComponentLink3URL: https://lcsc.com/product-detail/Multilayer-Ceramic-Capacitors-MLCC---SMD-SMT_IHHECHOLY-STONE-ENTERPRISE-CO.%2C-LTD-IHHECHOLY-STONE-ENTERPRISE-CO.%2C-LTD-C1206N680J202T_C106003.html
footprint CAP-1206 (1206 (3216M) Capacitor)
pins: 1, 2

## C1206N681J102T
designator C?  Capacitance: 680pF  (hidden comment: *)
Capacitor, Ceramic (MLCC), 680pF, ±5%, 1kV, C0G, ±5%, SMD 1206; Manufacturer: IHHEC(HOLY STONE ENTERPRISE CO., LTD); Manufacturer Part Number: C1206N681J102T; Package Size: 1206; JLCPCB Basic Part: No; JLCPCB Part Number: C106004; Supplier 1: LCSC; Category: Capacitors - MLCC; Supplier Part Number 1: C106004; Tolerance: ±5%; Voltage Rating: 1kV; Temperature Coefficient: C0G; RoHS: Yes; ComponentLink1Description: Datasheet; ComponentLink1URL: https://wmsc.lcsc.com/wmsc/upload/file/pdf/v2/lcsc/2304140030_IHHEC-HOLY-STONE-ENTERPRISE-CO---LTD-C1206N681J102T_C106004.pdf; ComponentLink2Description: JLCPCB Part URL; ComponentLink2URL: https://jlcpcb.com/partdetail/C106004; ComponentLink3Description: LCSC Part URL; ComponentLink3URL: https://lcsc.com/product-detail/Multilayer-Ceramic-Capacitors-MLCC---SMD-SMT_IHHECHOLY-STONE-ENTERPRISE-CO.%2C-LTD-IHHECHOLY-STONE-ENTERPRISE-CO.%2C-LTD-C1206N681J102T_C106004.html
footprint CAP-1206 (1206 (3216M) Capacitor)
pins: 1, 2

## C1206N681K631T
designator C?  Capacitance: 680pF  (hidden comment: *)
Capacitor, Ceramic (MLCC), 680pF, ±10%, 630V, NP0, ±10%, SMD 1206; Manufacturer: IHHEC(HOLY STONE ENTERPRISE CO., LTD); Manufacturer Part Number: C1206N681K631T; Package Size: 1206; JLCPCB Basic Part: No; JLCPCB Part Number: C106005; Supplier 1: LCSC; Category: Capacitors - MLCC; Supplier Part Number 1: C106005; Tolerance: ±10%; Voltage Rating: 630V; Temperature Coefficient: NP0; RoHS: Yes; ComponentLink1Description: Datasheet; ComponentLink1URL: https://wmsc.lcsc.com/wmsc/upload/file/pdf/v2/lcsc/2304140030_IHHEC-HOLY-STONE-ENTERPRISE-CO---LTD-C1206N681K631T_C106005.pdf; ComponentLink2Description: JLCPCB Part URL; ComponentLink2URL: https://jlcpcb.com/partdetail/C106005; ComponentLink3Description: LCSC Part URL; ComponentLink3URL: https://lcsc.com/product-detail/Multilayer-Ceramic-Capacitors-MLCC---SMD-SMT_IHHECHOLY-STONE-ENTERPRISE-CO.%2C-LTD-IHHECHOLY-STONE-ENTERPRISE-CO.%2C-LTD-C1206N681K631T_C106005.html
footprint CAP-1206 (1206 (3216M) Capacitor)
pins: 1, 2

## C1206N820J102T
designator C?  Capacitance: 82pF  (hidden comment: *)
Capacitor, Ceramic (MLCC), 82pF, ±5%, 1kV, C0G, ±5%, SMD 1206; Manufacturer: IHHEC(HOLY STONE ENTERPRISE CO., LTD); Manufacturer Part Number: C1206N820J102T; Package Size: 1206; JLCPCB Basic Part: No; JLCPCB Part Number: C106007; Supplier 1: LCSC; Category: Capacitors - MLCC; Supplier Part Number 1: C106007; Tolerance: ±5%; Voltage Rating: 1kV; Temperature Coefficient: C0G; RoHS: Yes; ComponentLink1Description: Datasheet; ComponentLink1URL: https://wmsc.lcsc.com/wmsc/upload/file/pdf/v2/lcsc/2304140030_IHHEC-HOLY-STONE-ENTERPRISE-CO---LTD-C1206N820J102T_C106007.pdf; ComponentLink2Description: JLCPCB Part URL; ComponentLink2URL: https://jlcpcb.com/partdetail/C106007; ComponentLink3Description: LCSC Part URL; ComponentLink3URL: https://lcsc.com/product-detail/Multilayer-Ceramic-Capacitors-MLCC---SMD-SMT_IHHECHOLY-STONE-ENTERPRISE-CO.%2C-LTD-IHHECHOLY-STONE-ENTERPRISE-CO.%2C-LTD-C1206N820J102T_C106007.html
footprint CAP-1206 (1206 (3216M) Capacitor)
pins: 1, 2

## C1206N822K050T
designator C?  Capacitance: 8.2nF  (hidden comment: *)
Capacitor, Ceramic (MLCC), 8.2nF, ±10%, 50V, NP0, ±10%, SMD 1206; Manufacturer: IHHEC(HOLY STONE ENTERPRISE CO., LTD); Manufacturer Part Number: C1206N822K050T; Package Size: 1206; JLCPCB Basic Part: No; JLCPCB Part Number: C106008; Supplier 1: LCSC; Category: Capacitors - MLCC; Supplier Part Number 1: C106008; Tolerance: ±10%; Voltage Rating: 50V; Temperature Coefficient: NP0; RoHS: Yes; ComponentLink1Description: Datasheet; ComponentLink1URL: https://wmsc.lcsc.com/wmsc/upload/file/pdf/v2/lcsc/2304140030_IHHEC-HOLY-STONE-ENTERPRISE-CO---LTD-C1206N822K050T_C106008.pdf; ComponentLink2Description: JLCPCB Part URL; ComponentLink2URL: https://jlcpcb.com/partdetail/C106008; ComponentLink3Description: LCSC Part URL; ComponentLink3URL: https://lcsc.com/product-detail/Multilayer-Ceramic-Capacitors-MLCC---SMD-SMT_IHHECHOLY-STONE-ENTERPRISE-CO.%2C-LTD-IHHECHOLY-STONE-ENTERPRISE-CO.%2C-LTD-C1206N822K050T_C106008.html
footprint CAP-1206 (1206 (3216M) Capacitor)
pins: 1, 2

## C1206U104J050T
designator C?  Capacitance: 100nF  (hidden comment: *)
Capacitor, Ceramic (MLCC), 100nF, ±5%, 50V, U2J, ±5%, SMD 1206; Manufacturer: IHHEC(HOLY STONE ENTERPRISE CO., LTD); Manufacturer Part Number: C1206U104J050T; Package Size: 1206; JLCPCB Basic Part: No; JLCPCB Part Number: C158070; Supplier 1: LCSC; Category: Capacitors - MLCC; Supplier Part Number 1: C158070; Tolerance: ±5%; Voltage Rating: 50V; Temperature Coefficient: U2J; RoHS: Yes; ComponentLink1Description: Datasheet; ComponentLink1URL: https://wmsc.lcsc.com/wmsc/upload/file/pdf/v2/lcsc/1810010923_IHHEC-HOLY-STONE-ENTERPRISE-CO---LTD-C1206U104J050T_C158070.pdf; ComponentLink2Description: JLCPCB Part URL; ComponentLink2URL: https://jlcpcb.com/partdetail/C158070; ComponentLink3Description: LCSC Part URL; ComponentLink3URL: https://lcsc.com/product-detail/Multilayer-Ceramic-Capacitors-MLCC---SMD-SMT_IHHECHOLY-STONE-ENTERPRISE-CO.%2C-LTD-IHHECHOLY-STONE-ENTERPRISE-CO.%2C-LTD-C1206U104J050T_C158070.html
footprint CAP-1206 (1206 (3216M) Capacitor)
pins: 1, 2

## C1206X5R226K160NT
designator C?  Capacitance: 22uF  (hidden comment: *)
Capacitor, Ceramic (MLCC), 22uF, ±10%, 16V, ±10%, SMD 1206; Manufacturer: SANYEAR; Manufacturer Part Number: C1206X5R226K160NT; Package Size: 1206; JLCPCB Basic Part: No; JLCPCB Part Number: C466809; Supplier 1: LCSC; Category: Capacitors - MLCC; Supplier Part Number 1: C466809; Tolerance: ±10%; Voltage Rating: 16V; RoHS: Yes; ComponentLink1Description: Datasheet; ComponentLink1URL: https://wmsc.lcsc.com/wmsc/upload/file/pdf/v2/lcsc/2304140030_SANYEAR-C1206X5R226K160NT_C466809.pdf; ComponentLink2Description: JLCPCB Part URL; ComponentLink2URL: https://jlcpcb.com/partdetail/C466809; ComponentLink3Description: LCSC Part URL; ComponentLink3URL: https://lcsc.com/product-detail/Multilayer-Ceramic-Capacitors-MLCC---SMD-SMT_SANYEAR-SANYEAR-C1206X5R226K160NT_C466809.html
footprint CAP-1206 (1206 (3216M) Capacitor)
pins: 1, 2

## C1206X5R226M160NT
designator C?  Capacitance: 22uF  (hidden comment: *)
Capacitor, Ceramic (MLCC), 22uF, ±20%, 16V, ±20%, SMD 1206; Manufacturer: SANYEAR; Manufacturer Part Number: C1206X5R226M160NT; Package Size: 1206; JLCPCB Basic Part: No; JLCPCB Part Number: C968784; Supplier 1: LCSC; Category: Capacitors - MLCC; Supplier Part Number 1: C968784; Tolerance: ±20%; Voltage Rating: 16V; RoHS: Yes; ComponentLink1Description: Datasheet; ComponentLink2Description: JLCPCB Part URL; ComponentLink2URL: https://jlcpcb.com/partdetail/C968784; ComponentLink3Description: LCSC Part URL; ComponentLink3URL: https://lcsc.com/product-detail/Multilayer-Ceramic-Capacitors-MLCC---SMD-SMT_SANYEAR-SANYEAR-C1206X5R226M160NT_C968784.html
footprint CAP-1206 (1206 (3216M) Capacitor)
pins: 1, 2

## C1206X6S226K6R3NT
designator C?  Capacitance: 22uF  (hidden comment: *)
Capacitor, Ceramic (MLCC), 22uF, ±10%, 6.3V, ±10%, SMD 1206; Manufacturer: SANYEAR; Manufacturer Part Number: C1206X6S226K6R3NT; Package Size: 1206; JLCPCB Basic Part: No; JLCPCB Part Number: C2844315; Supplier 1: LCSC; Category: Capacitors - MLCC; Supplier Part Number 1: C2844315; Tolerance: ±10%; Voltage Rating: 6.3V; RoHS: Yes; ComponentLink1Description: Datasheet; ComponentLink1URL: https://wmsc.lcsc.com/wmsc/upload/file/pdf/v2/lcsc/2108072230_SANYEAR-C1206X6S226K6R3NT_C2844315.pdf; ComponentLink2Description: JLCPCB Part URL; ComponentLink2URL: https://jlcpcb.com/partdetail/C2844315; ComponentLink3Description: LCSC Part URL; ComponentLink3URL: https://lcsc.com/product-detail/Multilayer-Ceramic-Capacitors-MLCC---SMD-SMT_SANYEAR-SANYEAR-C1206X6S226K6R3NT_C2844315.html
footprint CAP-1206 (1206 (3216M) Capacitor)
pins: 1, 2

## C1206X6S226K160NT
designator C?  Capacitance: 22uF  (hidden comment: *)
Capacitor, Ceramic (MLCC), 22uF, 16V, SMD 1206; Manufacturer: SANYEAR; Manufacturer Part Number: C1206X6S226K160NT; Package Size: 1206; JLCPCB Basic Part: No; JLCPCB Part Number: C2844317; Supplier 1: LCSC; Category: Capacitors - MLCC; Supplier Part Number 1: C2844317; Voltage Rating: 16V; RoHS: Yes; ComponentLink1Description: Datasheet; ComponentLink1URL: https://wmsc.lcsc.com/wmsc/upload/file/pdf/v2/lcsc/2108072230_SANYEAR-C1206X6S226K160NT_C2844317.pdf; ComponentLink2Description: JLCPCB Part URL; ComponentLink2URL: https://jlcpcb.com/partdetail/C2844317; ComponentLink3Description: LCSC Part URL; ComponentLink3URL: https://lcsc.com/product-detail/Multilayer-Ceramic-Capacitors-MLCC---SMD-SMT_SANYEAR-SANYEAR-C1206X6S226K160NT_C2844317.html
footprint CAP-1206 (1206 (3216M) Capacitor)
pins: 1, 2

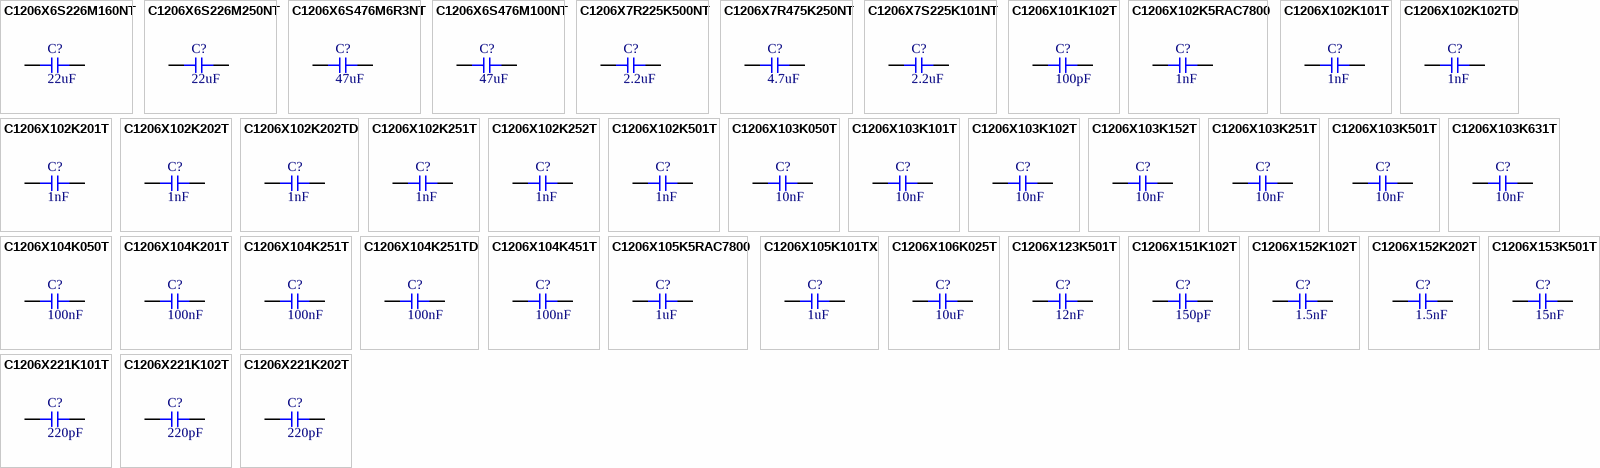
[diagram p18: symbols C1206X6S226M160NT to C1206X221K202T]

## C1206X6S226M160NT
designator C?  Capacitance: 22uF  (hidden comment: *)
Capacitor, Ceramic (MLCC), 22uF, ±20%, 16V, ±20%, SMD 1206; Manufacturer: SANYEAR; Manufacturer Part Number: C1206X6S226M160NT; Package Size: 1206; JLCPCB Basic Part: No; JLCPCB Part Number: C2844312; Supplier 1: LCSC; Category: Capacitors - MLCC; Supplier Part Number 1: C2844312; Tolerance: ±20%; Voltage Rating: 16V; RoHS: Yes; ComponentLink1Description: Datasheet; ComponentLink1URL: https://wmsc.lcsc.com/wmsc/upload/file/pdf/v2/lcsc/2304140030_SANYEAR-C1206X6S226M160NT_C2844312.pdf; ComponentLink2Description: JLCPCB Part URL; ComponentLink2URL: https://jlcpcb.com/partdetail/C2844312; ComponentLink3Description: LCSC Part URL; ComponentLink3URL: https://lcsc.com/product-detail/Multilayer-Ceramic-Capacitors-MLCC---SMD-SMT_SANYEAR-SANYEAR-C1206X6S226M160NT_C2844312.html
footprint CAP-1206 (1206 (3216M) Capacitor)
pins: 1, 2

## C1206X6S226M250NT
designator C?  Capacitance: 22uF  (hidden comment: *)
Capacitor, Ceramic (MLCC), 22uF, 25V, SMD 1206; Manufacturer: SANYEAR; Manufacturer Part Number: C1206X6S226M250NT; Package Size: 1206; JLCPCB Basic Part: No; JLCPCB Part Number: C2835562; Supplier 1: LCSC; Category: Capacitors - MLCC; Supplier Part Number 1: C2835562; Voltage Rating: 25V; RoHS: Yes; ComponentLink1Description: Datasheet; ComponentLink1URL: https://wmsc.lcsc.com/wmsc/upload/file/pdf/v2/lcsc/2304140030_SANYEAR-C1206X6S226M250NT_C2835562.pdf; ComponentLink2Description: JLCPCB Part URL; ComponentLink2URL: https://jlcpcb.com/partdetail/C2835562; ComponentLink3Description: LCSC Part URL; ComponentLink3URL: https://lcsc.com/product-detail/Multilayer-Ceramic-Capacitors-MLCC---SMD-SMT_SANYEAR-SANYEAR-C1206X6S226M250NT_C2835562.html
footprint CAP-1206 (1206 (3216M) Capacitor)
pins: 1, 2